# Altium schematic symbol library BARKO_SCHLIB.SchLib: 1064 symbols (part 1 of 11) (continued)
## C-18PF-0603 (continued)
CAP CER 18PF 50V C0G/NP0 0603; Manufacturer: Walsin Technologies; Manufacturer Part Number: 0603N180J500CT; Tolerance: 5%; Dielectric: C0G; .Creator: M.OZKAN; .PCBCHK: USED; Washability: OK; Supplier 1: Digi-Key; Stock 1: 334370; Pricing 1: 1=0.1, 10=0.033, 100=0.0149, 500=0.01062, 1000=0.00835 (USD); Case/Package: 0603; Case Code (Metric): 1608; Min Operating Temperature: -55°C; Max Operating Temperature: 125°C; Capacitance: 18pF; Packaging: Tape and Reel; Voltage Rating (DC): 50V; Length: 1.6mm; Depth: 0.8mm; Radiation Hardening: No; REACH SVHC: Unknown; Lead Free: Lead Free; ComponentLink1URL: https://www.verical.com/server-webapp/html/getDatasheet?partID=698319&src-supplier=Verical; ComponentLink1Description: https://www.verical.com/server-webapp/html/getDatasheet?partID=698319&src-supplier=Verical; Supplier Part Number 1: 1292-1494-6-ND; .SCHCHK: USED
footprint C-0603
pins: 1, 2

## C-22NF-0603
designator C?, comment 22NF  Case/Package: 0603  Voltage: 50V
CAP CER 0.022UF 50V X7R 0603L; Manufacturer: Yageo; Manufacturer Part Number: CC0603KRX7R9BB223; Dielectric Material: Ceramic; Insulation Resistance: 100GR; Tolerance: 10%; Washability: OK; .Creator: M.OZKAN; .PCBCHK: USED; Supplier 1: Digi-Key; Supplier Part Number 1: 311-1370-1-ND; Stock 1: 144094; Pricing 1: 1=0.10000, 10=0.06700, 100=0.03000, 500=0.02140, 1000=0.01682 (USD); RoHS: Yes; Mount: Surface Mount; Number of Pins: 2; Case Code (Metric): 1608; Case Code (Imperial): 0603; Min Operating Temperature: -55°C; Max Operating Temperature: 125°C; Termination: SMD/SMT; Composition: Ceramic; Package Quantity: 1; Capacitance: 22nF; Voltage Rating: 50V; Packaging: Tape and Reel; Voltage Rating (DC): 50V; Length: 1.6mm; Height: 0.8mm; Thickness: 0.035inch; Depth: 0.8mm; Width: 0.031inch; Radiation Hardening: No; Lead Free: Lead Free; Halogen Free: Halogen Free; REACH SVHC: No SVHC; ComponentLink1URL: https://datasheet.ciiva.com/156/mlccorderingcode-156177.pdf?src-supplier=Digi-Key; ComponentLink1Description: https://datasheet.ciiva.com/156/mlccorderingcode-156177.pdf?src-supplier=Digi-Key; ComponentLink2URL: https://datasheet.ciiva.com/156/mlccorderingcode-156178.pdf?src-supplier=Digi-Key; ComponentLink2Description: https://datasheet.ciiva.com/156/mlccorderingcode-156178.pdf?src-supplier=Digi-Key; ComponentLink3URL: https://datasheet.ciiva.com/156/mlccorderingcode-156179.pdf?src-supplier=Digi-Key; ComponentLink3Description: https://datasheet.ciiva.com/156/mlccorderingcode-156179.pdf?src-supplier=Digi-Key; ComponentLink4URL: https://datasheet.ciiva.com/11464/upy-gphc-x7r-6-3v-to-50v-8-11464741.pdf?src-supplier=Avnet; ComponentLink4Description: https://datasheet.ciiva.com/11464/upy-gphc-x7r-6-3v-to-50v-8-11464741.pdf?src-supplier=Avnet; ComponentLink5URL: https://datasheet.ciiva.com/8033/1489800-8033865.pdf?src-supplier=Element14; ComponentLink5Description: https://datasheet.ciiva.com/8033/1489800-8033865.pdf?src-supplier=Element14; ComponentLink6URL: https://datasheet.ciiva.com/8033/1489800-8033867.pdf?src-supplier=Element14; ComponentLink6Description: https://datasheet.ciiva.com/8033/1489800-8033867.pdf?src-supplier=Element14; ComponentLink7URL: https://datasheet.ciiva.com/16625/upy-gphc-x7r-6-3v-to-50v-8-16625532.pdf?src-supplier=Avnet+Europe; ComponentLink7Description: https://datasheet.ciiva.com/16625/upy-gphc-x7r-6-3v-to-50v-8-16625532.pdf?src-supplier=Avnet+Europe; ComponentLink8URL: https://datasheet.ciiva.com/8033/70765-8033869.pdf?src-supplier=Element14; ComponentLink8Description: https://datasheet.ciiva.com/8033/70765-8033869.pdf?src-supplier=Element14; ComponentLink9URL: https://datasheet.ciiva.com/28450/1489800-28450639.pdf?src-supplier=Element14; ComponentLink9Description: https://datasheet.ciiva.com/28450/1489800-28450639.pdf?src-supplier=Element14; Dielectric: X7R; .SCHCHK: USED
footprint C-0603
pins: 1, 2

## C-22NF-0805
designator C?, comment 22NF  Voltage Rating: 50V  Case Code (Imperial): 0805
CAP CER 0.022UF 50V X7R 0805; Manufacturer: Samsung; Manufacturer Part Number: CL21B223KBANNNC; Material: Ceramic; Tolerance: 10%; .PCBCHK: USED; .Creator: F:TALI; Washability: OK; Mount: Surface Mount; Case/Package: 0805; Case Code (Metric): 2012; Contact Plating: Tin; Min Operating Temperature: -55°C; Max Operating Temperature: 125°C; Packaging: Tape and Reel; Package Quantity: 1; Dielectric: X7R; Voltage: 50V; Voltage Rating (DC): 50V; Length: 2mm; Height: 0.65mm; Width: 0.049inch; Thickness: 0.03inch; Depth: 1.25mm; Radiation Hardening: No; Lead Free: Lead Free; ComponentLink1URL: http://www.samsungsem.com/kr/front/downloadcms.do?path=/kr/support/product-search/mlcc/__icsFiles/afieldfile/2014/11/05&fileName=C_CL21B223KBANNNC.pdf; ComponentLink1Description: http://www.samsungsem.com/kr/front/downloadcms.do?path=/kr/support/product-search/mlcc/__icsFiles/afieldfile/2014/11/05&fileName=C_CL21B223KBANNNC.pdf; ComponentLink2URL: https://www.verical.com/server-webapp/html/getDatasheet?partID=498011; ComponentLink2Description: https://www.verical.com/server-webapp/html/getDatasheet?partID=498011; ComponentLink3URL: http://www1.futureelectronics.com/doc/SAMSUNG%20PASSIVE/CL05B104KQ5NNNC.pdf; ComponentLink3Description: http://www1.futureelectronics.com/doc/SAMSUNG%20PASSIVE/CL05B104KQ5NNNC.pdf; ComponentLink4URL: https://produktinfo.conrad.com/datenblaetter/450000-474999/454724-da-01-en-VS_KONDENSATOR_0805.pdf; ComponentLink4Description: https://produktinfo.conrad.com/datenblaetter/450000-474999/454724-da-01-en-VS_KONDENSATOR_0805.pdf; Capacitance: 22nF; Number of Pins: 2; Dielectric Material: Ceramic; Termination: SMD/SMT; Ratings: AEC-Q200; ComponentLink5URL: http://datasheets.avx.com/AutoMLCC.pdf; ComponentLink5Description: http://datasheets.avx.com/AutoMLCC.pdf; ComponentLink6URL: http://www.avx.com/docs/catalogs/cauto.pdf; ComponentLink6Description: http://www.avx.com/docs/catalogs/cauto.pdf; ComponentLink7URL: https://www.verical.com/server-webapp/html/getDatasheet?partID=314608; ComponentLink7Description: https://www.verical.com/server-webapp/html/getDatasheet?partID=314608; Stock 1: 2102; Pricing 1: 1=0.54, 10=0.377, 100=0.2264, 500=0.1698, 1000=0.14338 (USD); Lead Pitch: 0.75mm; REACH SVHC: No SVHC; Stock 2: 40000; Pricing 2: 1=0.19, 10=0.134, 100=0.063, 500=0.04414, 1000=0.03655 (USD); ComponentLink8URL: https://www.verical.com/server-webapp/html/getDatasheet?partID=357920; ComponentLink8Description: https://www.verical.com/server-webapp/html/getDatasheet?partID=357920; ComponentLink9URL: http://www1.futureelectronics.com/doc/SAMSUNG/CL21B223JBANNNC.pdf; ComponentLink9Description: http://www1.futureelectronics.com/doc/SAMSUNG/CL21B223JBANNNC.pdf; Stock 3: 2492; Pricing 3: 1=0.33, 10=0.23, 100=0.1378, 500=0.10334, 1000=0.08726 (USD); .SCHCHK: USED; Supplier 1: Digi-Key; Supplier Part Number 1: 399-7344-6-ND
footprint C-0805
pins: 1, 2

## C-22NF-0805_1
designator C?, comment 22NF  Voltage Rating: 50V  Case Code (Imperial): 0805
CAP CER 0.022UF 50V Y5V 0805; Manufacturer: Samsung; Manufacturer Part Number: CL21F223ZBANNNC; Tolerance: 80%; Dielectric Material: Ceramic; .PCBCHK: USED; .Creator: F:TALI; Washability: OK; Stock 1: 40000; Pricing 1: 1=0.1, 10=0.059, 100=0.0262, 500=0.01868, 1000=0.01468 (USD); Mount: Surface Mount; Case/Package: 0805; Case Code (Metric): 2012; Min Operating Temperature: -30°C; Max Operating Temperature: 85°C; Packaging: Tape and Reel; Capacitance: 22nF; Package Quantity: 1; Dielectric: Y5V; Voltage Rating (DC): 50V; Length: 2mm; Height: 0.65mm; Width: 0.049inch; Thickness: 0.03inch; Depth: 1.25mm; Radiation Hardening: No; ComponentLink1URL: http://www.samsungsem.com/kr/support/product-search/mlcc/CL21F223ZBANNNC.jsp; ComponentLink1Description: http://www.samsungsem.com/kr/support/product-search/mlcc/CL21F223ZBANNNC.jsp; Stock 2: 4000; Pricing 2: 1=0.24, 10=0.165, 100=0.0834, 500=0.05706, 1000=0.05047 (USD); Weight: 0.000194oz; Termination: SMD/SMT; Composition: Ceramic; Lead Free: Lead Free; Halogen Free: Halogen Free; ComponentLink2URL: http://datasheet.octopart.com/CC0805ZRY5V9BB223-Yageo-datasheet-8324290.pdf; ComponentLink2Description: http://datasheet.octopart.com/CC0805ZRY5V9BB223-Yageo-datasheet-8324290.pdf; ComponentLink3URL: http://datasheet.octopart.com/CC0805ZRY5V9BB223-Yageo-datasheet-10882999.pdf; ComponentLink3Description: http://datasheet.octopart.com/CC0805ZRY5V9BB223-Yageo-datasheet-10882999.pdf; ComponentLink4URL: http://datasheet.octopart.com/CC0805ZRY5V9BB223-Yageo-datasheet-14421173.pdf; ComponentLink4Description: http://datasheet.octopart.com/CC0805ZRY5V9BB223-Yageo-datasheet-14421173.pdf; ComponentLink5URL: http://datasheet.octopart.com/CC0805ZRY5V9BB223-Yageo-datasheet-62058311.pdf; ComponentLink5Description: http://datasheet.octopart.com/CC0805ZRY5V9BB223-Yageo-datasheet-62058311.pdf; ComponentLink6URL: http://datasheet.octopart.com/CC0805ZRY5V9BB223-Yageo-datasheet-10883670.pdf; ComponentLink6Description: http://datasheet.octopart.com/CC0805ZRY5V9BB223-Yageo-datasheet-10883670.pdf; ComponentLink7URL: http://datasheet.octopart.com/CC0805ZRY5V9BB223-Yageo-datasheet-78855689.pdf; ComponentLink7Description: http://datasheet.octopart.com/CC0805ZRY5V9BB223-Yageo-datasheet-78855689.pdf; Stock 3: 3900; Pricing 3: 1=0.35, 10=0.237, 100=0.1344, 500=0.0949, 1000=0.08303 (USD); .SCHCHK: USED; Supplier 1: Digi-Key; Supplier Part Number 1: 1276-2709-6-ND
footprint C-0805
pins: 1, 2

## C-22PF-0603
designator C?, comment 22PF  Voltage Rating: 50V  Case/Package: 0603
CAP CER 22PF 50V C0G/NP0 0603; Manufacturer: Samsung; Manufacturer Part Number: CL10C220JB8NNNC; Material: Ceramic; Tolerance: 5%; Dielectric: C0G; Temperature Coefficient: 300ppm/°C; Insulation Resistance: 100GR; .PCBCHK: USED; .Creator: F:TALI; Washability: OK; Stock 1: 0; Pricing 1: 1=0.1, 10=0.056, 100=0.0251, 500=0.0179, 1000=0.01406 (USD); Mount: Surface Mount; Case Code (Metric): 1608; Case Code (Imperial): 0603; Contact Plating: Tin; Min Operating Temperature: -55°C; Max Operating Temperature: 125°C; Capacitance: 22pF; Voltage: 50V; Voltage Rating (DC): 50V; Package Quantity: 1; Packaging: Tape and Reel; Length: 1.6mm; Height: 0.8mm; Depth: 0.8mm; Width: 0.031inch; Thickness: 0.035inch; Radiation Hardening: No; Lead Free: Lead Free; ComponentLink1URL: http://www1.futureelectronics.com/doc/SAMSUNG%20PASSIVE/CL05B104KQ5NNNC.pdf; ComponentLink1Description: http://www1.futureelectronics.com/doc/SAMSUNG%20PASSIVE/CL05B104KQ5NNNC.pdf; ComponentLink2URL: https://media.digikey.com/pdf/Data%20Sheets/Samsung%20PDFs/CL_Series_MLCC_ds.pdf; ComponentLink2Description: https://media.digikey.com/pdf/Data%20Sheets/Samsung%20PDFs/CL_Series_MLCC_ds.pdf; ComponentLink3URL: https://www.distrelec.biz/Web/Downloads/_e/ng/MLCC_CatalogDownload2013_ENG.pdf?mime=application%2Fpdf; ComponentLink3Description: https://www.distrelec.biz/Web/Downloads/_e/ng/MLCC_CatalogDownload2013_ENG.pdf?mime=application%2Fpdf; ComponentLink4URL: https://produktinfo.conrad.com/datenblaetter/450000-474999/457135-da-01-en-VS_KONDENSATOR_0603.pdf; ComponentLink4Description: https://produktinfo.conrad.com/datenblaetter/450000-474999/457135-da-01-en-VS_KONDENSATOR_0603.pdf; Stock 2: 40000; Pricing 2: 1=0.1, 10=0.073, 100=0.0324, 500=0.02314, 1000=0.01818 (USD); Number of Pins: 2; Dielectric Material: Ceramic; Termination: SMD/SMT; REACH SVHC: No SVHC; ComponentLink5URL: http://www.avx.com/docs/Catalogs/ccog.pdf; ComponentLink5Description: http://www.avx.com/docs/Catalogs/ccog.pdf; ComponentLink6URL: https://www.verical.com/server-webapp/html/getDatasheet?partID=60906; ComponentLink6Description: https://www.verical.com/server-webapp/html/getDatasheet?partID=60906; ComponentLink7URL: http://www.farnell.com/datasheets/759117.pdf; ComponentLink7Description: http://www.farnell.com/datasheets/759117.pdf; ComponentLink8URL: http://catalogs.avx.com/SurfaceMount.pdf; ComponentLink8Description: http://catalogs.avx.com/SurfaceMount.pdf; ComponentLink9URL: http://uk.rs-online.com/webdocs/140c/0900766b8140c8fe.pdf; ComponentLink9Description: http://uk.rs-online.com/webdocs/140c/0900766b8140c8fe.pdf; Stock 3: 3383; Pricing 3: 1=0.1, 10=0.048, 100=0.0214, 500=0.01532, 1000=0.01203 (USD); ComponentLink10URL: http://www1.futureelectronics.com/doc/SAMSUNG/CL10C220JB8NFNC.pdf; ComponentLink10Description: http://www1.futureelectronics.com/doc/SAMSUNG/CL10C220JB8NFNC.pdf; ComponentLink11URL: http://www.samsungsem.com/kr/support/product-search/mlcc/CL10C220JB8NFNC.jsp; ComponentLink11Description: http://www.samsungsem.com/kr/support/product-search/mlcc/CL10C220JB8NFNC.jsp; .SCHCHK: USED; Supplier 1: Digi-Key; Supplier Part Number 1: 1276-1023-6-ND
footprint C-0603
pins: 1, 2

## C-22PF-0603_1
designator C?, comment 22PF  Voltage Rating: 50V  Case Code (Imperial): 0603
CAP CER 22PF 50V X7R 0603; Manufacturer: Kyocera AVX; Manufacturer Part Number: 06035C220JAT2A; Tolerance: 5%; Dielectric Material: Ceramic; .PCBCHK: USED; .Creator: F:TALI; Washability: OK; Stock 1: 40000; Pricing 1: 1=0.13, 10=0.098, 100=0.0437, 500=0.03124, 1000=0.02454 (USD); Mount: Surface Mount; Case/Package: 0603; Number of Pins: 2; Case Code (Metric): 1608; Min Operating Temperature: -55°C; Max Operating Temperature: 125°C; Packaging: Tape and Reel; Capacitance: 22pF; Package Quantity: 1; Dielectric: X7R; Termination: SMD/SMT; Voltage Rating (DC): 50V; Length: 1.6mm; Width: 0.032inch; Thickness: 0.035inch; Depth: 0.81mm; REACH SVHC: Unknown; Lead Free: Lead Free; ComponentLink1URL: http://catalogs.avx.com/SurfaceMount.pdf; ComponentLink1Description: http://catalogs.avx.com/SurfaceMount.pdf; ComponentLink2URL: http://www.farnell.com/datasheets/1679506.pdf; ComponentLink2Description: http://www.farnell.com/datasheets/1679506.pdf; ComponentLink3URL: http://www.mouser.com/ds/2/40/X7RDielectric-777024.pdf; ComponentLink3Description: http://www.mouser.com/ds/2/40/X7RDielectric-777024.pdf; Stock 2: 0; Pricing 2: 1=0.33, 10=0.227, 100=0.1286, 500=0.09076, 1000=0.07941 (USD); .SCHCHK: USED; Supplier 1: Digi-Key; Supplier Part Number 1: 478-6204-6-ND
footprint C-0603
pins: 1, 2

## C-22PF-0805
designator C?, comment 22PF  Voltage Rating: 50V  Case/Package: 0805
CAP CER 22PF 50V NP0 0805; Manufacturer: KEMET; Manufacturer Part Number: C0805C220J5GAC-TU; Dielectric Material: Ceramic; Tolerance: 5%; Dielectric: C0G; Temperature Coefficient: 30ppm/°C; .PCBCHK: USED; .Creator: F:TALI; Washability: OK; Stock 1: 0; Pricing 1: 1=0.11, 10=0.079, 100=0.0352, 500=0.02516, 1000=0.01977 (USD); Mount: PCB,Surface Mount; Weight: 0.000194oz; Case Code (Metric): 2012; Contact Material: Tin; Contact Plating: Matte,Tin; Min Operating Temperature: -55°C; Max Operating Temperature: 125°C; Packaging: Tape and Reel; Capacitance: 22pF; Package Quantity: 1; Voltage Rating (DC): 50V; Termination: SMD/SMT; Voltage: 50V; Length: 2mm; Height: 0.78mm; Width: 0.049inch; Thickness: 0.035inch; Depth: 1.25mm; Radiation Hardening: No; REACH SVHC: No SVHC; Lead Free: Lead Free; ComponentLink1URL: http://www.farnell.com/datasheets/1907778.pdf; ComponentLink1Description: http://www.farnell.com/datasheets/1907778.pdf; ComponentLink2URL: http://www.farnell.com/datasheets/1789732.pdf; ComponentLink2Description: http://www.farnell.com/datasheets/1789732.pdf; ComponentLink3URL: http://www.farnell.com/datasheets/2315501.pdf; ComponentLink3Description: http://www.farnell.com/datasheets/2315501.pdf; ComponentLink4URL: http://www.farnell.com/datasheets/1372242.pdf; ComponentLink4Description: http://www.farnell.com/datasheets/1372242.pdf; Stock 2: 10335; Pricing 2: 1=0.15, 10=0.106, 100=0.05, 500=0.03508, 1000=0.02904 (USD); Stock 3: 40000; Pricing 3: 1=0.21, 10=0.146, 100=0.0738, 500=0.05052, 1000=0.04468 (USD); Ratings: AEC-Q200; ComponentLink5URL: http://www.samsungsem.com/kr/support/product-search/mlcc/CL21C220JB61PNC.jsp; ComponentLink5Description: http://www.samsungsem.com/kr/support/product-search/mlcc/CL21C220JB61PNC.jsp; Case Code (Imperial): 0805; .SCHCHK: USED; Supplier 1: Digi-Key; Supplier Part Number 1: 399-1113-6-ND
footprint C-0805
pins: 1, 2

## C-22UF-0603_1
designator C?, comment 22UF  Voltage Rating: 6.3V  Case/Package: 0603
CAP CER 22UF 6.3V X5R 0603; Manufacturer: Murata; Manufacturer Part Number: GRM188R60J226MEA0D; Tolerance: 20%; Material: Ceramic; .PCBCHK: USED; .Creator: F:TALI; Washability: OK; Stock 1: 40000; Pricing 1: 1=0.32, 10=0.221, 100=0.1251, 500=0.08832, 1000=0.07728 (USD); Mount: Surface Mount; Weight: 0.000222oz; Case Code (Imperial): 0603; Min Operating Temperature: -55°C; Max Operating Temperature: 85°C; Capacitance: 22uF; Packaging: Tape and Reel; Package Quantity: 4000; Dielectric: X5R; Termination: SMD/SMT; Voltage Rating (DC): 6.3V; Length: 1.6mm; Height: 0.8mm; Width: 0.8mm; Thickness: 0.039inch; Depth: 0.8mm; REACH SVHC: No SVHC; Lead Free: Lead Free; ComponentLink1URL: https://www.murata.com/~/media/webrenewal/support/library/catalog/products/capacitor/mlcc/c02e.ashx?la=en-us; ComponentLink1Description: https://www.murata.com/~/media/webrenewal/support/library/catalog/products/capacitor/mlcc/c02e.ashx?la=en-us; Case Code (Metric): 1608; Stock 2: 40000; Pricing 2: 1=0.28, 10=0.193, 100=0.1094, 500=0.07722, 1000=0.06757 (USD); Contact Plating: Tin; Voltage: 6.3V; Radiation Hardening: No; ComponentLink2URL: https://www.verical.com/server-webapp/html/getDatasheet?partID=353311; ComponentLink2Description: https://www.verical.com/server-webapp/html/getDatasheet?partID=353311; ComponentLink3URL: http://www1.futureelectronics.com/doc/SAMSUNG%20PASSIVE/CL05B104KQ5NNNC.pdf; ComponentLink3Description: http://www1.futureelectronics.com/doc/SAMSUNG%20PASSIVE/CL05B104KQ5NNNC.pdf; ComponentLink4URL: http://www.samsungsem.com/kr/support/product-search/mlcc/CL10A226MQ8NRNC.jsp; ComponentLink4Description: http://www.samsungsem.com/kr/support/product-search/mlcc/CL10A226MQ8NRNC.jsp; ComponentLink5URL: https://produktinfo.conrad.com/datenblaetter/450000-474999/457121-da-01-en-VS_KONDENSATOR_0603.pdf; ComponentLink5Description: https://produktinfo.conrad.com/datenblaetter/450000-474999/457121-da-01-en-VS_KONDENSATOR_0603.pdf; Stock 3: 30000; Pricing 3: 1=0.34, 10=0.229, 100=0.1162, 500=0.0795, 1000=0.07032 (USD); ComponentLink6URL: http://www.samsungsem.com/kr/support/product-search/mlcc/CL10A226MQ8NRNE.jsp; ComponentLink6Description: http://www.samsungsem.com/kr/support/product-search/mlcc/CL10A226MQ8NRNE.jsp; ComponentLink7URL: https://www.verical.com/server-webapp/html/getDatasheet?partID=359618; ComponentLink7Description: https://www.verical.com/server-webapp/html/getDatasheet?partID=359618; .SCHCHK: USED; Supplier 1: Digi-Key; Supplier Part Number 1: 1276-2868-6-ND
footprint C-0603
pins: 1, 2

## C-22UF-0805 TANT
designator C?  Capacitance: 22uF  Voltage Rating (DC): 6.3V  Case/Package: 0805  (hidden comment: *)
CAP TANT 22UF 6.3V 20% 0805; Manufacturer: Kyocera AVX; Manufacturer Part Number: F920J226MPA; Dielectric Material: Tantalum; ESR (Equivalent Series Resistance): 5R; Leakage Current: 1.4uA; Polarity: Polar; Dissipation Factor: 10%; .PCBCHK: USED; .Creator: F:TALI; Washability: OK; Stock 1: 14227; Pricing 1: 1=0.43, 10=0.302, 100=0.1986, 500=0.14708, 1000=0.12502 (USD); Stock 2: 1537; Pricing 2: 1=3.49, 10=2.823, 100=2.1554 (USD); Mount: Surface Mount; Number of Pins: 2; Case Code (Metric): 2012; Case Code (Imperial): 0805; Min Operating Temperature: -55°C; Max Operating Temperature: 125°C; Tolerance: 20%; Packaging: Tape and Reel; Package Quantity: 1; Voltage Rating: 6.3V; Termination: SMD/SMT; Features: General Purpose; Length: 2mm; Height: 1.5mm; Width: 0.053inch; Height - Seated (Max): 0.059inch; Depth: 1.35mm; Radiation Hardening: No; REACH SVHC: No SVHC; Lead Free: Lead Free; ComponentLink1URL: http://datasheets.avx.com/TAC.pdf; ComponentLink1Description: http://datasheets.avx.com/TAC.pdf; ComponentLink2URL: http://www.avxcorp.com/docs/Catalogs/tac.pdf; ComponentLink2Description: http://www.avxcorp.com/docs/Catalogs/tac.pdf; ComponentLink3URL: http://www.avx.com/docs/Catalogs/tac.pdf; ComponentLink3Description: http://www.avx.com/docs/Catalogs/tac.pdf; .SCHCHK: USED; Supplier 1: Digi-Key; Supplier Part Number 1: 478-8119-6-ND
footprint C-0805
pins: 1, 2
text: +

## C-22UF-1206 TANT
designator C?, comment 22UF  Voltage Rating: 10V  Case/Package: 1206
CAP TANT 22UF 10V 10% 1206; Manufacturer: Kyocera AVX; Manufacturer Part Number: F971A226KAA; ESR (Equivalent Series Resistance): 3R; Leakage Current: 2.2uA; Dissipation Factor: 15%; .PCBCHK: USED; .Creator: F:TALI; Washability: OK; Stock 1: 1221; Pricing 1: 1=0.8, 10=0.586, 100=0.4021, 500=0.31836, 1000=0.2681 (USD); Stock 2: 0; Mount: Surface Mount; Weight: 0.000571oz; Case Code (Metric): 3216; Case Code (Imperial): 1206; Min Operating Temperature: -55°C; Max Operating Temperature: 125°C; Package Quantity: 2000; Capacitance: 22uF; Tolerance: 10%; Packaging: Tape and Reel; Termination: SMD/SMT; Length: 0.126inch; Height: 1.6mm; Width: 0.063inch; Height - Seated (Max): 0.047inch; ComponentLink1URL: http://www.mouser.com/ds/2/40/f97-776922.pdf; ComponentLink1Description: http://www.mouser.com/ds/2/40/f97-776922.pdf; ComponentLink2URL: http://datasheets.avx.com/f97.pdf; ComponentLink2Description: http://datasheets.avx.com/f97.pdf; ComponentLink3URL: http://nichicon-us.com/english/products/pdfs/e-f97.pdf; ComponentLink3Description: http://nichicon-us.com/english/products/pdfs/e-f97.pdf; .SCHCHK: USED; Supplier 1: Digi-Key; Supplier Part Number 1: 478-8546-6-ND
pins: 1, 2
text: +

## C-22UF-1206_1 TANT
designator C?, comment 22UF  Voltage Rating: 16V  Case/Package: 1206
CAP TANT 22UF 16V 10% 1206; Manufacturer: Nichicon; Manufacturer Part Number: F951C226KQAAQ2; ESR (Equivalent Series Resistance): 3R; .PCBCHK: USED; .Creator: F:TALI; Washability: OK; Stock 1: 0; Mount: Surface Mount; Case Code (Metric): 3216; Case Code (Imperial): 1206; Min Operating Temperature: -55°C; Max Operating Temperature: 125°C; Package Quantity: 2500; Packaging: Tape and Reel; Capacitance: 22uF; Tolerance: 10%; Termination: SMD/SMT; Features: General Purpose; Length: 0.126inch; Height: 0.8mm; Width: 0.063inch; Height - Seated (Max): 0.063inch; Depth: 1.6mm; Radiation Hardening: No; ComponentLink1URL: //media.digikey.com/pdf/Data%20Sheets/Nichicon%20PDFs/F95_Series.pdf; ComponentLink1Description: //media.digikey.com/pdf/Data%20Sheets/Nichicon%20PDFs/F95_Series.pdf; ComponentLink2URL: http://www.avx.com/docs/Catalogs/f95.pdf; ComponentLink2Description: http://www.avx.com/docs/Catalogs/f95.pdf; ComponentLink3URL: http://datasheets.avx.com/f95.pdf; ComponentLink3Description: http://datasheets.avx.com/f95.pdf; Stock 2: 10152; Pricing 2: 1=0.85, 10=0.648, 100=0.4634, 500=0.35874, 1000=0.30892 (USD); .SCHCHK: USED; Supplier 1: Digi-Key; Supplier Part Number 1: 478-8461-1-ND
pins: 1, 2
text: +

## C-22UF-1210
designator C?, comment 22UF  Voltage Rating: 25V  Case Code (Imperial): 1210
CAP CER 22UF 25V X7R 1210; Manufacturer: Samsung; Manufacturer Part Number: CL32B226KAJNNNE; Material: Ceramic; Tolerance: 10%; .PCBCHK: USED; .Creator: F:TALI; Washability: OK; Stock 1: 0; Pricing 1: 1=1.02, 10=0.777, 100=0.556, 500=0.43042 (USD); Mount: Surface Mount; Case/Package: 1210; Case Code (Metric): 3225; Min Operating Temperature: -55°C; Max Operating Temperature: 125°C; Package Quantity: 1; Packaging: Tape and Reel; Capacitance: 22uF; Dielectric: X7R; Voltage Rating (DC): 25V; Length: 3.2mm; Height: 2.5mm; Width: 0.098inch; Thickness: 0.106inch; Depth: 2.5mm; Radiation Hardening: No; Lead Free: Lead Free; ComponentLink1URL: https://media.digikey.com/pdf/Data%20Sheets/Samsung%20PDFs/CL_Series_MLCC_ds.pdf; ComponentLink1Description: https://media.digikey.com/pdf/Data%20Sheets/Samsung%20PDFs/CL_Series_MLCC_ds.pdf; Stock 2: 0; Pricing 2: 1=0.91, 10=0.671, 100=0.4598, 500=0.36402 (USD); ComponentLink2URL: http://www.samsungsem.com/kr/support/product-search/mlcc/CL32B226KAJNFNE.jsp; ComponentLink2Description: http://www.samsungsem.com/kr/support/product-search/mlcc/CL32B226KAJNFNE.jsp; Stock 3: 0; Pricing 3: 1=1.63, 10=1.289, 100=0.9664, 500=0.7302 (USD); Dielectric Material: Ceramic; Voltage: 25V; Dissipation Factor: 10%; Termination: SMD/SMT; .SCHCHK: USED; Supplier 1: Digi-Key; Supplier Part Number 1: 1276-3392-1-ND
footprint C-1210
pins: 1, 2

## C-22UF-1411 TANT
designator C?, comment 22UF  Case/Package: 1411  Voltage Rating: 16V
CAP TANT 22UF 16V 20% 1411; Manufacturer: KEMET; Manufacturer Part Number: T491B226M016AT; ESR (Equivalent Series Resistance): 2.2R; Polarity: Polar; Life (Hours): 2000Hour; Dissipation Factor: 6%; .PCBCHK: USED; .Creator: F:TALI; Washability: OK; Supplier 1: Digi-Key; Supplier Part Number 1: 399-3717-6-ND; Stock 1: 62791; Pricing 1: 1=0.64, 10=0.473, 100=0.3246, 500=0.25696, 1000=0.21638 (USD); Mount: Surface Mount; Number of Pins: 2; Case Code (Metric): 3528; Case Code (Imperial): 1411; Min Operating Temperature: -55°C; Max Operating Temperature: 125°C; Capacitance: 22uF; Tolerance: 20%; Packaging: Tape and Reel; Package Quantity: 1; Termination: SMD/SMT; Voltage Rating (DC): 16V; Features: General Purpose; Length: 3.5mm; Height: 2.1mm; Width: 0.11inch; Height - Seated (Max): 0.083inch; Depth: 2.8mm; Radiation Hardening: No; REACH SVHC: No SVHC; Lead Free: Lead Free; ComponentLink1URL: http://www.jameco.com/Jameco/Products/ProdDS/2021112.pdf; ComponentLink1Description: http://www.jameco.com/Jameco/Products/ProdDS/2021112.pdf; ComponentLink2URL: https://api.kemet.com/component-edge/download/datasheet/T491B226M016AT.pdf; ComponentLink2Description: https://api.kemet.com/component-edge/download/datasheet/T491B226M016AT.pdf; ComponentLink3URL: http://www.mouser.com/ds/2/212/KEM_T2005_T491-1093550.pdf; ComponentLink3Description: http://www.mouser.com/ds/2/212/KEM_T2005_T491-1093550.pdf; ComponentLink4URL: https://search.kemet.com/component-edge/download/datasheet/T491B226M016AT.pdf; ComponentLink4Description: https://search.kemet.com/component-edge/download/datasheet/T491B226M016AT.pdf; ComponentLink5URL: http://www.farnell.com/datasheets/1923792.pdf; ComponentLink5Description: http://www.farnell.com/datasheets/1923792.pdf; ComponentLink6URL: http://datasheet.iiic.cc/kemet/T491B226M016AT.pdf; ComponentLink6Description: http://datasheet.iiic.cc/kemet/T491B226M016AT.pdf; .SCHCHK: USED
footprint C-TANTB-3528
pins: 1, 2
text: +

## C-33NF-0603
designator C?, comment 33NF  Voltage Rating: 100V  Case Code (Imperial): 0603
CAP CER 0.033UF 100V X8R 0603; Manufacturer: TDK; Manufacturer Part Number: CGA3E3X8R2A333M080AB; Tolerance: 20%; .PCBCHK: USED; .Creator: F:TALI; Washability: OK; Stock 1: 2994; Pricing 1: 1=0.23, 10=0.155, 100=0.0787, 500=0.05382, 1000=0.04761 (USD); Mount: Surface Mount; Case/Package: 0603; Case Code (Metric): 1608; Min Operating Temperature: -55°C; Max Operating Temperature: 150°C; Package Quantity: 4000; Packaging: Cut Tape; Features: High Temperature; Length: 0.063inch; Width: 0.031inch; Thickness: 0.035inch; Ratings: AEC-Q200; Capacitance: 33nF; Stock 2: 803; Pricing 2: 1=0.33, 10=0.226, 100=0.1147, 500=0.07848, 1000=0.06943 (USD); Weight: 7.1E-05oz; Dielectric: X8R; Termination: SMD/SMT; Voltage Rating (DC): 100V; Height: 0.8mm; .SCHCHK: USED; Supplier 1: Digi-Key; Supplier Part Number 1: 445-12582-6-ND
footprint C-0603
pins: 1, 2

## C-33NF-1206
designator C?, comment 33NF  Voltage Rating: 630V  Case Code (Imperial): 1206
CAP CER 0.033UF 630V X7R 1206; Manufacturer: Samsung; Manufacturer Part Number: CL31B333KHHSFNE; Tolerance: 10%; .PCBCHK: USED; .Creator: F:TALI; Washability: OK; Mount: Surface Mount; Case/Package: 1206; Case Code (Metric): 3216; Min Operating Temperature: -55°C; Max Operating Temperature: 125°C; Package Quantity: 1; Packaging: Cut Tape; Length: 0.126inch; Width: 0.063inch; Thickness: 0.057inch; Lead Free: Lead Free; ComponentLink1URL: http://www.samsungsem.com/kr/support/product-search/mlcc/CL31B333KHHSFNE.jsp; ComponentLink1Description: http://www.samsungsem.com/kr/support/product-search/mlcc/CL31B333KHHSFNE.jsp; Capacitance: 33nF; Stock 1: 0; Pricing 1: 1=0.29, 10=0.198, 100=0.1121, 500=0.07912, 1000=0.06923 (USD); Stock 2: 3230; Pricing 2: 1=0.65, 10=0.458, 100=0.3018, 500=0.22356, 1000=0.19003 (USD); Features: Soft Termination; Ratings: AEC-Q200; Stock 3: 1732; Pricing 3: 1=0.22, 10=0.2, 100=0.1797, 500=0.159 (USD); .SCHCHK: USED; Supplier 1: Digi-Key; Supplier Part Number 1: 1276-3159-6-ND
footprint C-1206
pins: 1, 2

## C-33PF-0805
designator C?, comment 33PF  Voltage Rating: 50V  Case/Package: 0805
CAP CER 33PF 50V C0G/NP0 0805; Manufacturer 1: Wurth Electronics; Manufacturer Part Number: 885012007054; Tolerance: 5%; .Creator: M.OZKAN; .PCBCHK: USED; Supplier 1: Digi-Key; Supplier Part Number 1: 732-7849-1-ND; RoHS: Yes; Category: Ceramic Capacitors; Stock: 1587; Pricing: 1=0,10000, 10=0,04900, 100=0,04410, 500=0,03898 (USD); Mount: Surface Mount; Case Code (Imperial): 0805; Case Code (Metric): 2012; Min Operating Temperature: -55°C; Max Operating Temperature: 125°C; Packaging: Tape and Reel; Capacitance: 33pF; Length: 0.079inch; Width: 0.049inch; Thickness: 0.028inch; ComponentLink1URL: http://www.farnell.com/datasheets/2031703.pdf?src-supplier=Farnell; ComponentLink1Description: http://www.farnell.com/datasheets/2031703.pdf?src-supplier=Farnell; ComponentLink2URL: https://katalog.we-online.de/pbs/datasheet/885012007054.pdf?src-supplier=Digi-Key; ComponentLink2Description: https://katalog.we-online.de/pbs/datasheet/885012007054.pdf?src-supplier=Digi-Key; .SCHCHK: USED
footprint C-0805
pins: 1, 2

## C-39PF-0603
designator C?, comment 39PF  Voltage Rating: 50V  Case/Package: 0603
CAP CER 39PF 50V C0G/NP0 0603; Manufacturer: Samsung; Manufacturer Part Number: CL10C390JB8NNNC; Material: Ceramic; Tolerance: 5%; Dielectric: C0G; Temperature Coefficient: 300ppm/°C; .PCBCHK: USED; .Creator: F:TALI; Washability: OK; Stock 1: 0; Pricing 1: 1=0.1, 10=0.056, 100=0.0251, 500=0.0179, 1000=0.01406 (USD); Mount: Surface Mount; Case Code (Metric): 1608; Case Code (Imperial): 0603; Contact Plating: Tin; Min Operating Temperature: -55°C; Max Operating Temperature: 125°C; Packaging: Tape and Reel; Package Quantity: 1; Capacitance: 39pF; Length: 1.6mm; Height: 0.8mm; Width: 0.031inch; Thickness: 0.035inch; Depth: 0.8mm; Radiation Hardening: No; ComponentLink1URL: https://www.verical.com/server-webapp/html/getDatasheet?partID=357660; ComponentLink1Description: https://www.verical.com/server-webapp/html/getDatasheet?partID=357660; ComponentLink2URL: https://produktinfo.conrad.com/datenblaetter/450000-474999/456989-da-01-en-VS_KONDENSATOR_0603.pdf; ComponentLink2Description: https://produktinfo.conrad.com/datenblaetter/450000-474999/456989-da-01-en-VS_KONDENSATOR_0603.pdf; Voltage: 50V; Stock 2: 3576; Pricing 2: 1=0.1, 10=0.063, 100=0.0281, 500=0.02008, 1000=0.01578 (USD); Voltage Rating (DC): 50V; REACH SVHC: Unknown; Lead Free: Lead Free; Stock 3: 2880; Pricing 3: 1=0.13, 10=0.09, 100=0.0424, 500=0.0297, 1000=0.02459 (USD); .SCHCHK: USED; Supplier 1: Digi-Key; Supplier Part Number 1: 1276-1087-6-ND
footprint C-0603
pins: 1, 2

## C-47NF-0402
designator C?, comment 47NF  Voltage Rating: 16V  Case/Package: 0402
Cap Ceramic 0.047uF 16V X7R 10% SMD 0402 125C Paper T/R; Manufacturer: Samsung; Manufacturer Part Number: CL05B473KO5NNNC; .Creator: F:TALI; .PCBCHK: USED; Washability: OK; RoHS: Yes; Mount: Surface Mount; Case Code (Metric): 1005; Case Code (Imperial): 0402; Contact Plating: Tin; Min Operating Temperature: -55°C; Max Operating Temperature: 125°C; Capacitance: 47nF; Tolerance: 10%; Dielectric: X7R; Package Quantity: 1; Packaging: Tape and Reel; Voltage: 16V; Voltage Rating (DC): 16V; Length: 1mm; Height: 0.5mm; Width: 0.02inch; Thickness: 0.022inch; Depth: 0.5mm; Radiation Hardening: No; Lead Free: Lead Free; ComponentLink1URL: https://www.verical.com/server-webapp/html/getDatasheet?partID=355279&src-supplier=Verical; ComponentLink1Description: https://www.verical.com/server-webapp/html/getDatasheet?partID=355279&src-supplier=Verical; ComponentLink2URL: https://www.distrelec.biz/Web/Downloads/_e/ng/MLCC_CatalogDownload2013_ENG.pdf?mime=application%2Fpdf&src-supplier=Distrelec; ComponentLink2Description: https://www.distrelec.biz/Web/Downloads/_e/ng/MLCC_CatalogDownload2013_ENG.pdf?mime=application%2Fpdf&src-supplier=Distrelec; ComponentLink3URL: http://www1.futureelectronics.com/doc/SAMSUNG%20PASSIVE/CL05B104KQ5NNNC.pdf?src-supplier=Future+Electronics; ComponentLink3Description: http://www1.futureelectronics.com/doc/SAMSUNG%20PASSIVE/CL05B104KQ5NNNC.pdf?src-supplier=Future+Electronics; .SCHCHK: USED; Supplier 1: Digi-Key; Supplier Part Number 1: 311-1362-1-ND
footprint C-0402
pins: 1, 2

## C-47NF-0603
designator C?, comment 47NF  Voltage Rating: 50V  Case Code (Imperial): 0603
CAP CER 0.047UF 50V X7R 0603; Manufacturer: Samsung; Manufacturer Part Number: CL10B473KB8NNNC; Material: Ceramic; Tolerance: 10%; Dielectric: Y5V; Dissipation Factor: 2.5%; .PCBCHK: USED; .Creator: F:TALI; Washability: OK; Stock 1: 0; Pricing 1: 1=0.1, 10=0.038, 100=0.0168, 500=0.01204, 1000=0.00945 (USD); Mount: Surface Mount; Case/Package: 0603; Case Code (Metric): 1608; Contact Plating: Tin; Min Operating Temperature: -55°C; Max Operating Temperature: 125°C; Capacitance: 47nF; Voltage Rating (DC): 50V; Packaging: Tape and Reel; Package Quantity: 4000; Voltage: 50V; Length: 1.6mm; Width: 0.031inch; Thickness: 0.035inch; Depth: 0.8mm; Radiation Hardening: No; Lead Free: Lead Free; ComponentLink1URL: https://media.digikey.com/pdf/Data%20Sheets/Samsung%20PDFs/CL_Series_MLCC_ds.pdf; ComponentLink1Description: https://media.digikey.com/pdf/Data%20Sheets/Samsung%20PDFs/CL_Series_MLCC_ds.pdf; ComponentLink2URL: https://www.distrelec.biz/Web/Downloads/_e/ng/MLCC_CatalogDownload2013_ENG.pdf?mime=application%2Fpdf; ComponentLink2Description: https://www.distrelec.biz/Web/Downloads/_e/ng/MLCC_CatalogDownload2013_ENG.pdf?mime=application%2Fpdf; ComponentLink3URL: https://www.verical.com/server-webapp/html/getDatasheet?partID=359560; ComponentLink3Description: https://www.verical.com/server-webapp/html/getDatasheet?partID=359560; ComponentLink4URL: http://www.rapidonline.com/pdf/71-0317.pdf; ComponentLink4Description: http://www.rapidonline.com/pdf/71-0317.pdf; ComponentLink5URL: https://produktinfo.conrad.com/datenblaetter/450000-474999/456947-da-01-en-VS_KONDENSATOR_0603.pdf; ComponentLink5Description: https://produktinfo.conrad.com/datenblaetter/450000-474999/456947-da-01-en-VS_KONDENSATOR_0603.pdf; Height: 0.8mm; Dielectric Material: Ceramic; ComponentLink6URL: http://capacitoredge.kemet.com/capedge2/DataSheet?pn=C0603C473K5RACTU; ComponentLink6Description: http://capacitoredge.kemet.com/capedge2/DataSheet?pn=C0603C473K5RACTU; Stock 2: 1174; Pricing 2: 1=0.14, 10=0.1, 100=0.0469, 500=0.0329, 1000=0.02724 (USD); Number of Pins: 2; Termination: SMD/SMT; Lead Pitch: 0.7mm; REACH SVHC: No SVHC; ComponentLink7URL: http://www.farnell.com/datasheets/2119950.pdf; ComponentLink7Description: http://www.farnell.com/datasheets/2119950.pdf; ComponentLink8URL: http://www.farnell.com/datasheets/1851736.pdf; ComponentLink8Description: http://www.farnell.com/datasheets/1851736.pdf; ComponentLink9URL: http://www.farnell.com/datasheets/1776093.pdf; ComponentLink9Description: http://www.farnell.com/datasheets/1776093.pdf; ComponentLink10URL: https://www.verical.com/server-webapp/html/getDatasheet?partID=94279; ComponentLink10Description: https://www.verical.com/server-webapp/html/getDatasheet?partID=94279; ComponentLink11URL: http://catalogs.avx.com/SurfaceMount.pdf; ComponentLink11Description: http://catalogs.avx.com/SurfaceMount.pdf; ComponentLink12URL: http://www.avx.com/docs/catalogs/cx7r.pdf; ComponentLink12Description: http://www.avx.com/docs/catalogs/cx7r.pdf; ComponentLink13URL: http://datasheets.avx.com/X7RDielectric.pdf; ComponentLink13Description: http://datasheets.avx.com/X7RDielectric.pdf; ComponentLink14URL: http://www.farnell.com/datasheets/84526.pdf; ComponentLink14Description: http://www.farnell.com/datasheets/84526.pdf; ComponentLink15URL: https://www.verical.com/server-webapp/html/getDatasheet?partID=94281; ComponentLink15Description: https://www.verical.com/server-webapp/html/getDatasheet?partID=94281; ComponentLink16URL: http://www.farnell.com/datasheets/1679506.pdf; ComponentLink16Description: http://www.farnell.com/datasheets/1679506.pdf; ComponentLink17URL: http://www.avx.com/docs/Catalogs/cpack.pdf; ComponentLink17Description: http://www.avx.com/docs/Catalogs/cpack.pdf; ComponentLink18URL: http://www.mouser.com/ds/2/40/X7RDielectric-777024.pdf; ComponentLink18Description: http://www.mouser.com/ds/2/40/X7RDielectric-777024.pdf; ComponentLink19URL: https://www.alliedelec.com/m/d/a24bb5190bea413b2ff164816f55e87c.pdf; ComponentLink19Description: https://www.alliedelec.com/m/d/a24bb5190bea413b2ff164816f55e87c.pdf; Stock 3: 0; Pricing 3: 1=0.14, 10=0.1, 100=0.0443, 500=0.03166, 1000=0.02488 (USD); Composition: Ceramic; Halogen Free: Halogen Free; ComponentLink20URL: http://www.yageo.com/documents/recent/UPY-GPHC_X7R_6.3V-to-50V_18.pdf; ComponentLink20Description: http://www.yageo.com/documents/recent/UPY-GPHC_X7R_6.3V-to-50V_18.pdf; ComponentLink21URL: http://www.yageo.com/exep/pages/download/literatures/ProductSelectionGuide%202014_Final_2.pdf; ComponentLink21Description: http://www.yageo.com/exep/pages/download/literatures/ProductSelectionGuide%202014_Final_2.pdf; ComponentLink22URL: http://documents.rs-components.com/techlib://itc_doclist_GB.htm?stockno=6698811; ComponentLink22Description: http://documents.rs-components.com/techlib://itc_doclist_GB.htm?stockno=6698811; ComponentLink23URL: http://www.farnell.com/datasheets/1489800.pdf; ComponentLink23Description: http://www.farnell.com/datasheets/1489800.pdf; ComponentLink24URL: https://www.verical.com/server-webapp/html/getDatasheet?partID=403593; ComponentLink24Description: https://www.verical.com/server-webapp/html/getDatasheet?partID=403593; ComponentLink25URL: http://www1.futureelectronics.com/doc/SAMSUNG%20PASSIVE/CL05B104KQ5NNNC.pdf; ComponentLink25Description: http://www1.futureelectronics.com/doc/SAMSUNG%20PASSIVE/CL05B104KQ5NNNC.pdf; ComponentLink26URL: https://www.verical.com/server-webapp/html/getDatasheet?partID=359683; ComponentLink26Description: https://www.verical.com/server-webapp/html/getDatasheet?partID=359683; ComponentLink27URL: https://produktinfo.conrad.com/datenblaetter/450000-474999/458718-da-01-en-VS_KONDENSATOR_0402.pdf; ComponentLink27Description: https://produktinfo.conrad.com/datenblaetter/450000-474999/458718-da-01-en-VS_KONDENSATOR_0402.pdf; ComponentLink28URL: http://www.yageo.com/documents/recent/UPY-GPHC_X7R_6.3V-to-50V_8.pdf; ComponentLink28Description: http://www.yageo.com/documents/recent/UPY-GPHC_X7R_6.3V-to-50V_8.pdf; ComponentLink29URL: http://www.farnell.com/datasheets/1734573.pdf; ComponentLink29Description: http://www.farnell.com/datasheets/1734573.pdf; .SCHCHK: USED; Supplier 1: Digi-Key; Supplier Part Number 1: 1276-1063-6-ND
footprint C-0603
pins: 1, 2

## C-47NF-1206
designator C?, comment 47NF  Voltage Rating (DC): 50V  Case/Package: 1206
CAP CER 47NF 50V  X7R 1206; Manufacturer: Samsung; Manufacturer Part Number: CL31B473KBCNNND; Tolerance: 10%; Material: Ceramic; .Creator: F:TALI; .PCBCHK: USED; Washability: OK; Mount: Surface Mount; Min Operating Temperature: -55°C; Max Operating Temperature: 125°C; Capacitance: 47nF; Dielectric: X7R; Packaging: Tape and Reel; Package Quantity: 10000; Voltage Rating: 50V; Voltage: 50V; Length: 3.2mm; Height: 0.85mm; Depth: 1.6mm; Width: 0.063inch; Thickness: 0.039inch; Radiation Hardening: No; Lead Free: Lead Free; ComponentLink1URL: http://www.samsungsem.com/kr/front/downloadcms.do?path=/kr/support/product-search/mlcc/__icsFiles/afieldfile/2014/11/05&fileName=C_CL31B473KBCNNND.pdf&src-supplier=Digi-Key; ComponentLink1Description: http://www.samsungsem.com/kr/front/downloadcms.do?path=/kr/support/product-search/mlcc/__icsFiles/afieldfile/2014/11/05&fileName=C_CL31B473KBCNNND.pdf&src-supplier=Digi-Key; ComponentLink2URL: https://www.verical.com/server-webapp/html/getDatasheet?partID=357475&src-supplier=Verical; ComponentLink2Description: https://www.verical.com/server-webapp/html/getDatasheet?partID=357475&src-supplier=Verical; ComponentLink3URL: http://www1.futureelectronics.com/doc/SAMSUNG/CL31B473KBCNNND.pdf?src-supplier=Future+Electronics; ComponentLink3Description: http://www1.futureelectronics.com/doc/SAMSUNG/CL31B473KBCNNND.pdf?src-supplier=Future+Electronics; Composition: Ceramic; Halogen Free: Halogen Free; ComponentLink4URL: https://www.verical.com/server-webapp/html/getDatasheet?partID=473581&src-supplier=Verical; ComponentLink4Description: https://www.verical.com/server-webapp/html/getDatasheet?partID=473581&src-supplier=Verical; ComponentLink5URL: http://www.mouser.com/ds/2/447/Yageo_UPY-GP_NP0_16V-to-50V_9-358835.pdf?src-supplier=Mouser; ComponentLink5Description: http://www.mouser.com/ds/2/447/Yageo_UPY-GP_NP0_16V-to-50V_9-358835.pdf?src-supplier=Mouser; Case Code (Metric): 3216; Case Code (Imperial): 1206; ComponentLink6URL: https://www.verical.com/server-webapp/html/getDatasheet?partID=358694&src-supplier=Verical; ComponentLink6Description: https://www.verical.com/server-webapp/html/getDatasheet?partID=358694&src-supplier=Verical; ComponentLink7URL: http://www1.futureelectronics.com/doc/SAMSUNG%20PASSIVE/CL05B104KQ5NNNC.pdf?src-supplier=Future+Electronics; ComponentLink7Description: http://www1.futureelectronics.com/doc/SAMSUNG%20PASSIVE/CL05B104KQ5NNNC.pdf?src-supplier=Future+Electronics; ComponentLink8URL: https://produktinfo.conrad.com/datenblaetter/450000-474999/452141-da-01-en-VS_KONDENSATOR_1206.pdf?src-supplier=Conrad; ComponentLink8Description: https://produktinfo.conrad.com/datenblaetter/450000-474999/452141-da-01-en-VS_KONDENSATOR_1206.pdf?src-supplier=Conrad; Dielectric Material: Ceramic; Termination: SMD/SMT; .SCHCHK: USED; Supplier 1: Digi-Key; Supplier Part Number 1: 1276-2782-6-ND
footprint C-1206
pins: 1, 2

## C-47PF-0402
designator C?, comment 47PF  Voltage: 50V  Case/Package: 0402